# Altium footprint library TH Capasitor.PcbLib: 36 footprints (part 1 of 3)
Each footprint in its own frame and in the unit in brackets; x right, y up, seen from the top. Pads: shape width x height; smd on the part's side, far side on the other; paste and mask are expansions set on the pad; w line width, h text height; cw(c..) or ccw(c..) is an arc to the next point about the centre after c.
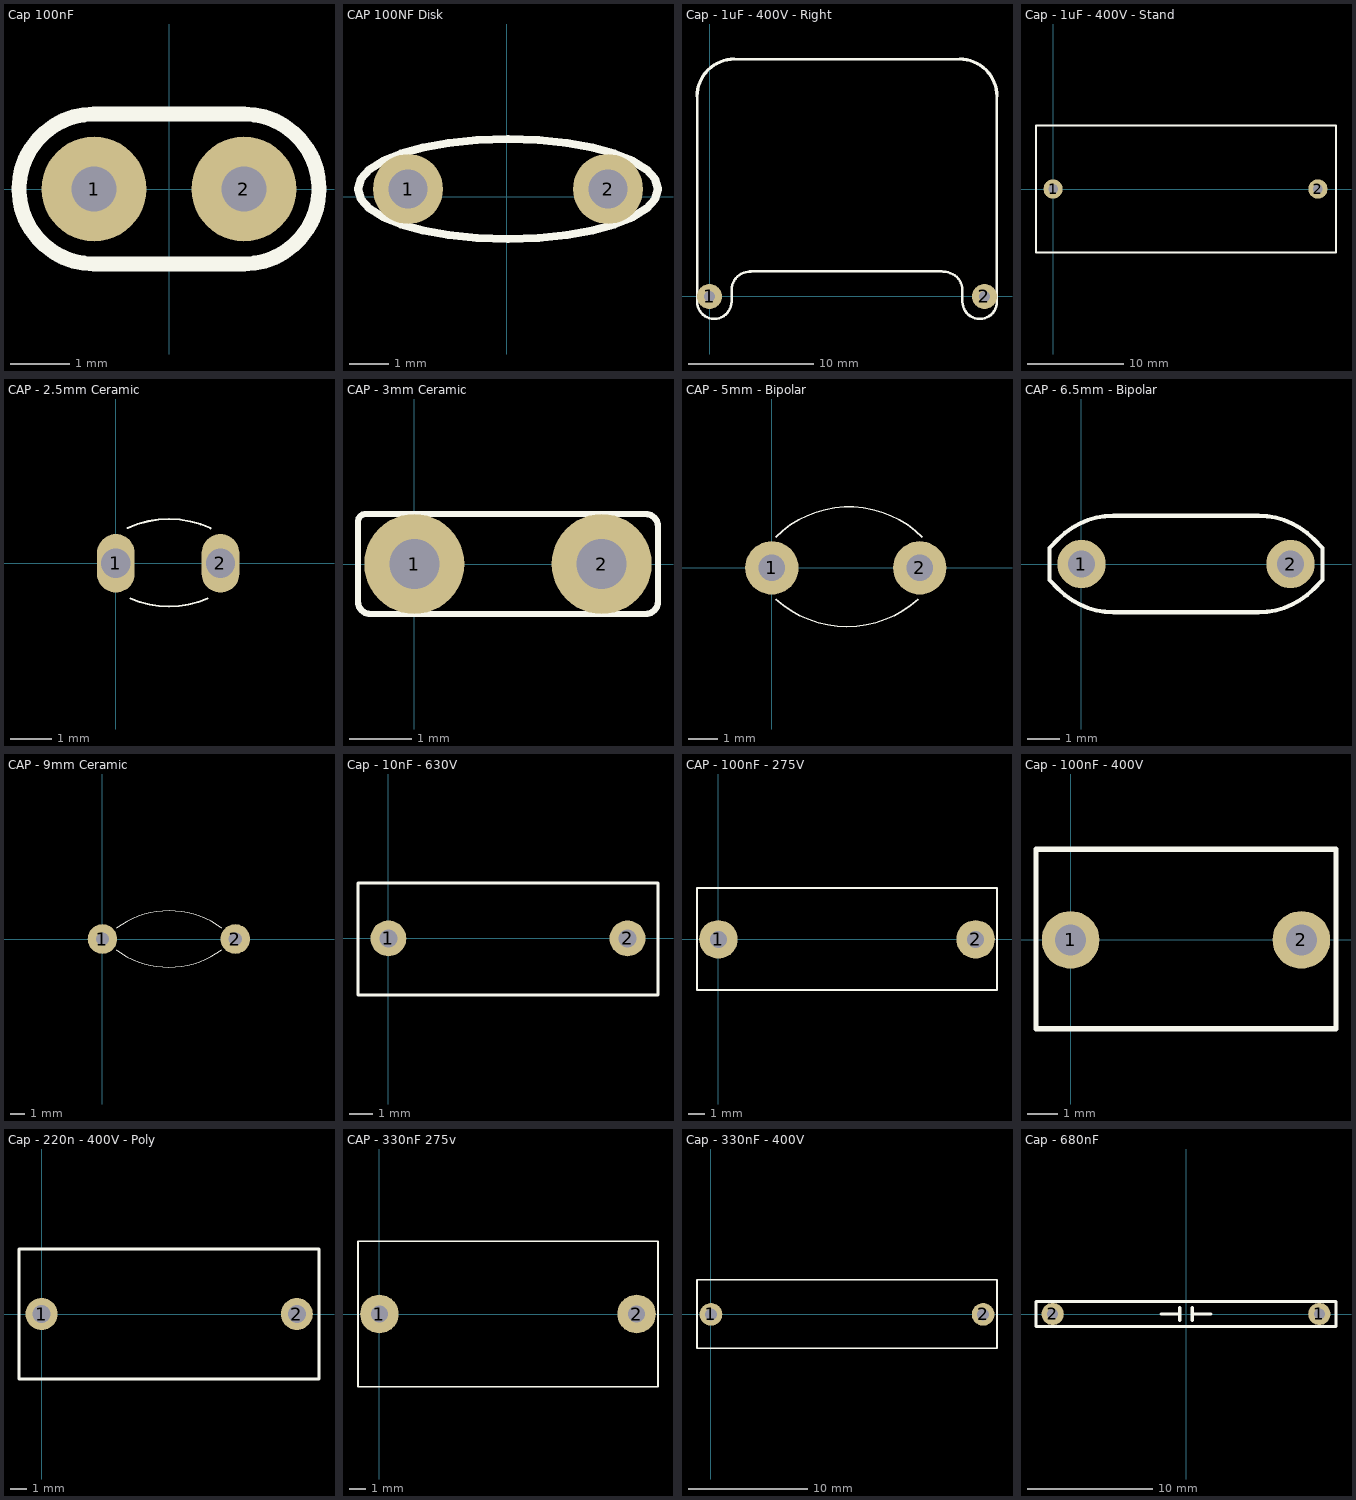
[diagram p0: the footprints below, top view; thin cyan lines are the x and y axes]

## Cap 100nF [mil]
height 196.85
pads (2):
  round 70 hole 30: 1(-50,0) 2(50,0)
Top Overlay:
  lines w10: -100,0 ccw(c-50,0) -50,-50 50,-50 ccw(c50,0) 100,0 ccw(c50,0) 50,50 -50,50 ccw(c-50,0) -100,0
3D body "User Library-K104M15X7RF53L2.STEP": height 275.59, standoff -59.06, extent -78.73,-48.22 78.75,50.2

## CAP 100NF Disk [mil]
pads (2):
  round 70 hole 39.37: 1(-98.57,7.56) 2(101.43,7.56)
Top Overlay:
  lines w8: -148.57,7.56 -145.57,-2.64 -137.07,-12.04 -123.57,-20.54 -105.47,-27.94 -83.37,-34.04 -57.87,-38.54 -29.37,-41.44 1.43,-42.44 32.03,-41.44 60.33,-38.54 85.83,-34.04 107.93,-27.94 126.13,-20.54 139.83,-12.04 148.43,-2.64 151.43,7.56 148.43,17.76 139.83,27.16 126.13,35.66 107.93,43.06 85.83,49.16 60.33,53.66 32.03,56.56 1.43,57.56 -29.37,56.56 -57.87,53.66 -83.37,49.16 -105.47,43.06 -123.57,35.66 -137.07,27.16 -145.57,17.76 -148.57,7.56
3D body "User Library-Ceramic Disc Capacitor 0_2in pitch.STEP": height 275.59, standoff -59.06, extent -136.79,-28.4 138.44,38.39

## Cap - 1uF - 400V - Right [mm]
pads (2):
  round 2 hole 0.85: 1(0,0) 2(22,0)
Top Overlay:
  lines w0.2: -1,16 -1,-0.4 ccw(c0.38,-0.4) 1.76,-0.4 1.76,0.52 cw(c3.236,0.514) 3.305,1.988 ; 2,19 20,19 ; 3.2,2 18.59,2.003 ; 18.695,1.968 cw(c18.764,0.494) 20.24,0.5 20.24,-0.42 ccw(c21.62,-0.42) 23,-0.42 23,16
  lines w0.254: -1.001,16 cw(c2,16) 2,19.001 ; 20,19.001 cw(c20,16) 23.001,16

## Cap - 1uF - 400V - Stand [mm]
height 16.65
pads (2):
  round 2 hole 1: 1(0,0) 2(27.58,0)
Top Overlay:
  lines w0.2: -1.778,-6.604 29.464,-6.604 29.464,6.604 -1.778,6.604 -1.778,-6.604
3D body "User Library-Vishay_1uF-400V_MKT_373_STD_27_5pitch.STEP": height 23, standoff -3, extent -1.71,-6.51 29.29,6.49

## CAP - 2.5mm Ceramic [mm] "cap2.5mmc"
pads (2):
  oval 0.9x1.4 hole 0.7: 1(0,0) 2(2.5,0)
Top Overlay:
  lines w0.05: 0.284,0.843 cw(c1.27,-1.27) 2.263,0.84 ; 0.348,-0.837 ccw(c1.27,1.27) 2.192,-0.837

## CAP - 3mm Ceramic [mm] "CAP3MMC"
pads (2):
  round 1.6 hole 0.8: 1(0,0) 2(3,0)
Top Overlay:
  lines w0.1: -0.9,-0.6 ccw(c-0.7,-0.6) -0.7,-0.8 3.7,-0.8 ccw(c3.7,-0.6) 3.9,-0.6 3.9,-0.1 3.9,0.6 ccw(c3.7,0.6) 3.7,0.8 -0.775,0.8 ccw(c-0.775,0.675) -0.9,0.675 -0.9,0 -0.9,-0.6

## CAP - 5mm - Bipolar [mm] "cap5mmc"
pads (2):
  round 1.8 hole 0.9: 1(0,0) 2(5,0)
Top Overlay:
  lines w0.05: 0.13,-1.056 ccw(c2.54,1.608) 4.95,-1.056 ; 0.13,1.039 cw(c2.606,-1.438) 5.083,1.039

## CAP - 6.5mm - Bipolar [mm]
pads (2):
  round 1.5 hole 0.85: 1(0,0) 2(6.5,0)
Top Overlay:
  lines w0.127: -1,-0.5 -0.707,-0.793 ccw(c1,0.914) 1,-1.5 5.5,-1.5 ccw(c5.5,0.914) 7.207,-0.793 7.5,-0.5 7.5,0.5 7.207,0.793 ccw(c5.5,-0.914) 5.5,1.5 1,1.5 ccw(c1,-0.914) -0.707,0.793 -1,0.5 -1,-0.5

## CAP - 9mm Ceramic [mm]
pads (2):
  round 2 hole 0.9: 1(0,0) 2(9,0)
Top Overlay:
  lines w0.05: 0.936,-0.744 ccw(c4.495,4.129) 8.072,-0.731 ; 0.945,0.731 cw(c4.522,-4.129) 8.081,0.744

## Cap - 10nF - 630V [mil]
pads (2):
  round 60 hole 30: 1(0,0) 2(400,0)
Top Overlay:
  lines w5: -50.97,-94.52 451,-94.52 451,92.52 -50.97,92.52 -50.97,-94.52
3D body "Cap 10n - 630V Poly_2009.STEP": height 480, standoff -68.11, extent -50.97,-94.52 451,92.52

## CAP - 100nF - 275V [mil] "100N 275V"
pads (2):
  round 90 hole 40: 1(0,0) 2(600,0)
Top Overlay:
  lines w3.94: -50,-118.11 650,-118.11 650,0 650,120 -50,120 -50,0 -50,-118.11
3D body: height 236.27, standoff 0, extent 285,5 285,5

## Cap - 100nF - 400V [mil]
pads (2):
  round 75 hole 40: 1(0,0) 2(300,0)
Top Overlay:
  lines w7: -45,-115.39 -45,117.65 345,117.65 345,-115.39 -45,-115.39
3D body "Cap 100n - 400V Poly.STEP": height 460, standoff -88.11, extent -30.5,-115.39 334.5,117.65

## Cap - 220n - 400V - Poly [mil]
pads (2):
  round 75 hole 42: 1(0,0) 2(600,0)
Top Overlay:
  lines w7: -53,-152.52 652,-152.52 652,152.52 -53,152.52 -53,-152.52
3D body "Cap 220n - 400V Poly.STEP": height 508.74, standoff -39.37, extent -53,-152.52 652,152.52

## CAP - 330nF 275v [mil] "cap 330n 275v"
pads (2):
  round 90 hole 40: 1(0,0) 2(600,0)
Top Overlay:
  lines w3.94: -50,-170 650,-170 650,0 650,120 650,170 -50,170 -50,0 -50,-170

## Cap - 330nF - 400V [mil]
pads (2):
  round 75 hole 40: 1(0,0) 2(900,0)
Top Overlay:
  lines w5: -46.26,-112.21 945.87,-112.21 945.87,114.21 -46.26,114.21 -46.26,-112.21
3D body "Cap 330n - 400V Poly_2009.STEP": height 430, standoff -118.11, extent -18.04,-112.21 917,114.21

## Cap - 680nF [mil]
height 393.7
pads (2):
  round 70 hole 35: 1(420,0) 2(-420,0)
Top Overlay:
  lines w10: -78.74,0 -19.68,0 ; -19.68,-19.68 -19.68,19.68 ; 19.68,-19.68 19.68,19.68 ; 19.68,0 78.74,0 ; -472.44,-39.37 472.44,-39.37 472.44,39.37 -472.44,39.37 -472.44,-39.37
3D body "680nF.STEP": height 497.8, standoff -33.7, extent -472.13,-13.39 472.76,683.32